# Altium footprint library USER_Lib.PcbLib: 105 footprints (part 3 of 7)
Each footprint in its own frame and in the unit in brackets; x right, y up, seen from the top. Pads: shape width x height; smd on the part's side, far side on the other; paste and mask are expansions set on the pad; w line width, h text height; cw(c..) or ccw(c..) is an arc to the next point about the centre after c.
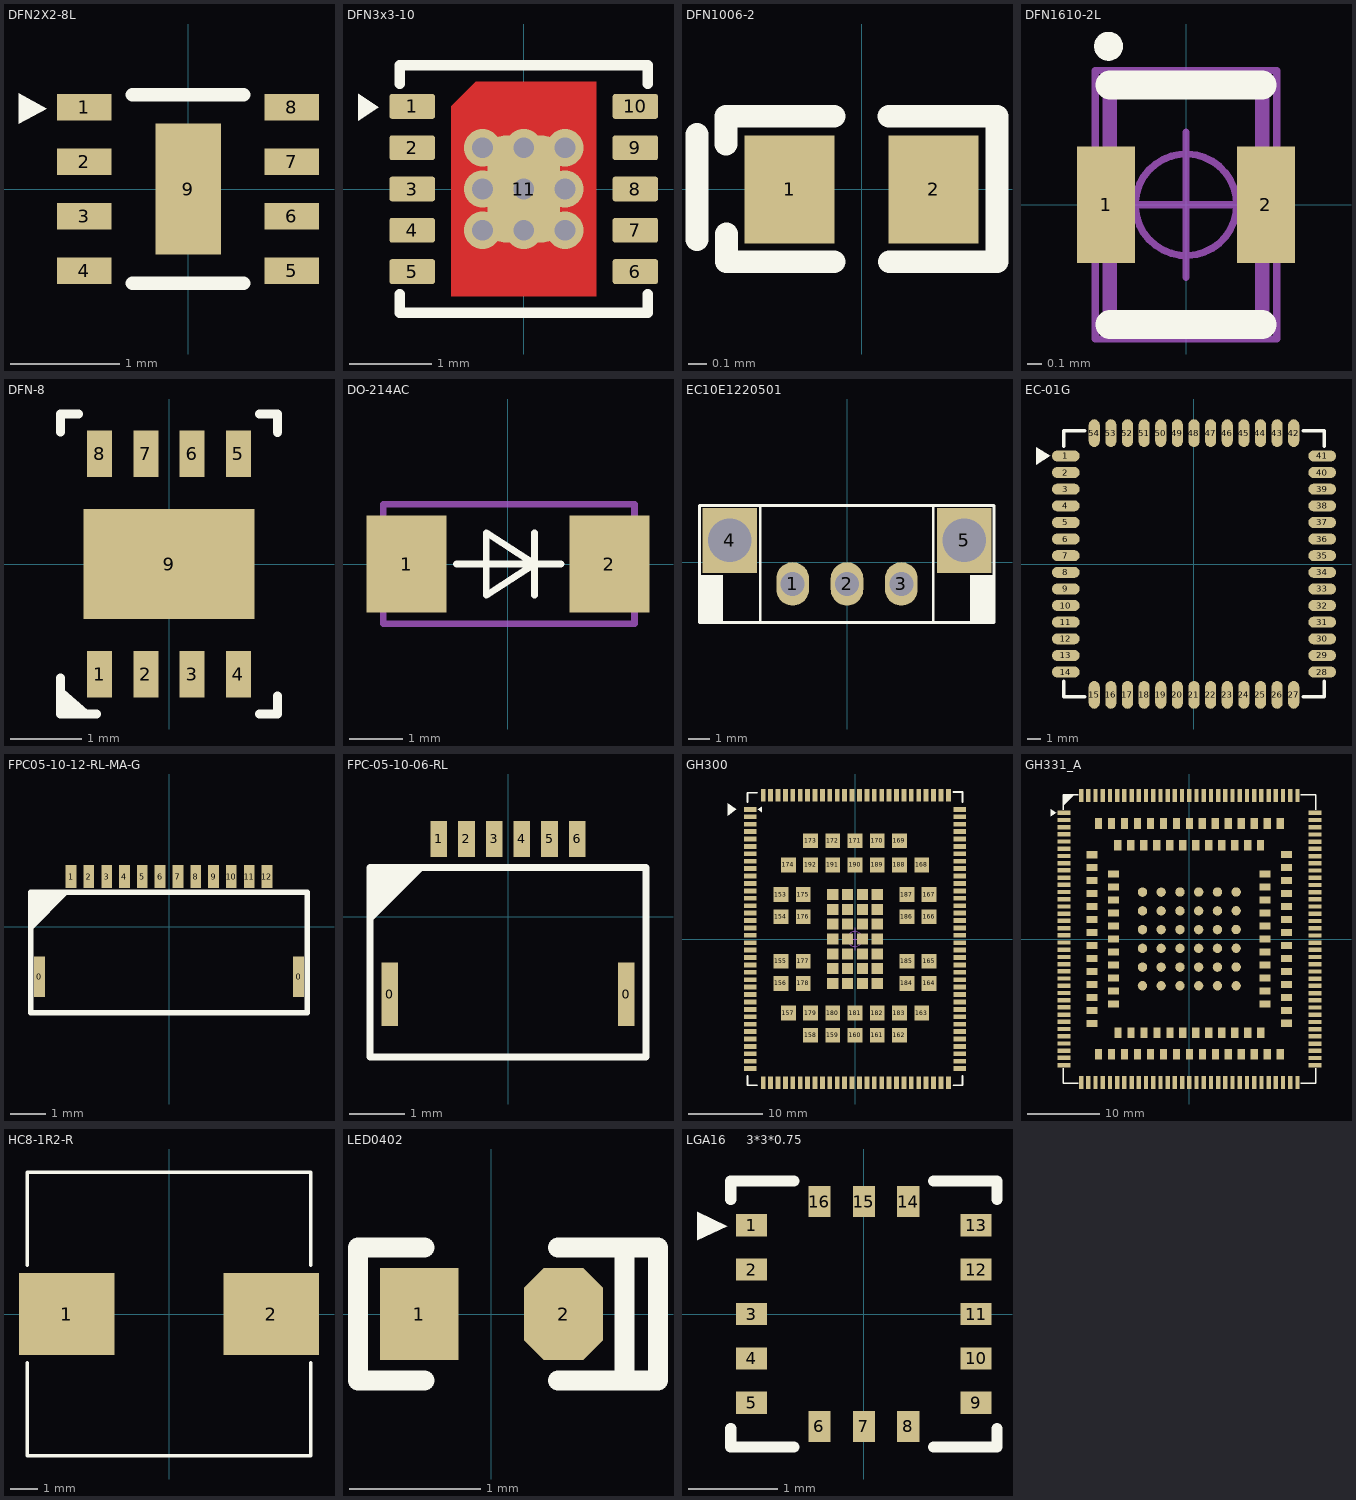
[diagram p2: the footprints below, top view; thin cyan lines are the x and y axes]

## DFN2X2-8L [mm]
pads (9):
  rect 0.5x0.24 smd mask+0.102: 1(-0.95,0.75) 2(-0.95,0.25) 3(-0.95,-0.25) 4(-0.95,-0.75) 5(0.95,-0.75) 6(0.95,-0.25) 7(0.95,0.25) 8(0.95,0.75)
  rect 0.6x1.2 smd mask+0.102: 9(0,0)
Top Overlay:
  region: -1.549,0.597 -1.295,0.737 -1.549,0.876
  lines w0.127: -0.508,-0.864 0.508,-0.864 ; -0.508,0.864 0.508,0.864
3D body "DFN2X2-8L.STEP": height 0.75, standoff 0, extent -1,-1 1,1

## DFN3x3-10 [mm]
pads (11):
  rrect20% 0.55x0.3 smd mask+0.102: 1(-1.35,1) 2(-1.35,0.5) 3(-1.35,0) 4(-1.35,-0.5) 5(-1.35,-1) 6(1.35,-1) 7(1.35,-0.5) 8(1.35,0) 9(1.35,0.5) 10(1.35,1)
  rrect50% 0.875x1.3 smd mask+0.102: 11(0,0)
via -0.5,0.5 diameter 0.45 hole 0.25
via 0,0.5 diameter 0.45 hole 0.25
via 0.5,0.5 diameter 0.45 hole 0.25
via 0.5,0 diameter 0.45 hole 0.25
via 0,0 diameter 0.45 hole 0.25
via -0.5,0 diameter 0.45 hole 0.25
via -0.5,-0.5 diameter 0.45 hole 0.25
via 0,-0.5 diameter 0.45 hole 0.25
via 0.5,-0.5 diameter 0.45 hole 0.25
Top Layer:
  region: -0.875,-1.3 -0.875,1.005 -0.58,1.3 0.875,1.3 0.875,-1.3
Top Overlay:
  region: -2.007,1.156 -1.753,0.991 -2.007,0.826
  lines w0.127: -1.5,-1.274 -1.5,-1.5 1.5,-1.5 1.5,-1.276 ; -1.5,1.276 -1.5,1.5 1.5,1.5 1.5,1.274
Top Solder:
  region: -0.875,-1.3 -0.875,1.005 -0.58,1.3 0.875,1.3 0.875,-1.3
3D body "DFN3x3-10.STEP": height 0.65, standoff 0, extent -1.5,-1.5 1.5,1.5

## DFN1006-2 [mm]
pads (2):
  rect 0.5x0.6 smd mask+0.102: 1(-0.4,0) 2(0.4,0)
Top Overlay:
  lines w0.127: -0.914,-0.279 -0.914,0.076 -0.914,0.305 ; -0.753,0.251 -0.753,0.406 ; -0.752,-0.402 -0.153,-0.402 ; -0.752,0.406 -0.751,0.406 -0.152,0.406 ; -0.751,-0.402 -0.751,-0.247 ; 0.152,0.406 0.751,0.406 ; 0.153,-0.402 0.752,-0.402 0.752,0.406
3D body "DFN1006-2.STEP": height 0.48, standoff -0.02, extent -0.5,-0.3 0.5,0.3

## DFN1610-2L [mm] "DFN, 2-Leads, Body 1.60x1.00mm, Pitch 1.10mm, IPC High Density"
height 0.55
pads (2):
  rect 0.4x0.8 smd: 1(-0.55,0) 2(0.55,0)
Top Overlay:
  circle w0.1: c-0.533,1.092 r0.05
  lines w0.2: -0.525,-0.825 0.525,-0.825 ; -0.525,0.825 0.525,0.825
Mechanical 13:
  lines w0.1: -0.525,-0.825 0.525,-0.825 0.525,0.825 -0.525,0.825 -0.525,-0.825
Mechanical 15:
  circle w0.05: c0,0 r0.35
  lines w0.05: -0.5,0 0.5,0 ; 0,-0.5 0,0.5 ; -0.625,-0.925 0.625,-0.925 0.625,0.925 -0.625,0.925 -0.625,-0.925
3D body "DFN110P100X55-2L.step": height 0.55, standoff 0, extent -0.775,-0.825 0.775,0.825

## DFN-8 [mm] "MCP1726_DFN-8"
pads (9):
  rect 0.35x0.65 smd mask+0.102: 1(-0.975,-1.55) 2(-0.325,-1.55) 3(0.325,-1.55) 4(0.975,-1.55) 5(0.975,1.55) 6(0.325,1.55) 7(-0.325,1.55) 8(-0.975,1.55)
  rect 2.4x1.55 smd mask+0.102: 9(0,0)
Top Overlay:
  lines w0.127: -1.524,-1.6 -1.524,-2.108 -1.016,-2.108 ; -1.524,1.854 -1.524,2.108 -1.27,2.108 ; -1.522,-1.945 -1.352,-2.104 ; -1.514,-1.816 -1.184,-2.103 ; 1.269,2.106 1.523,2.106 1.523,1.852 ; 1.27,-2.108 1.524,-2.108 1.524,-1.854

## DO-214AC [mm]
pads (2):
  rect 1.5x1.82 smd mask+0.102: 1(-1.9,0) 2(1.9,0)
Top Overlay:
  lines w0.127: -0.965,0 0,0 0.991,0 ; 0.495,-0.584 0.495,0 ; 0.495,0.584 0.495,0 ; 0.508,0 0.495,0 ; 0.495,0 -0.406,-0.584 -0.406,0 -0.406,0.584 0.495,0
Mechanical 15:
  lines w0.127: 2.367,-1.082 2.367,1.118 -2.337,1.118 -2.337,-1.118 2.368,-1.118
3D body: height 1.7, standoff 0, extent -2.337,-1.118 2.362,1.118

## EC10E1220501 [mm]
pads (5):
  oval 1.5x2 hole 1.1: 1(-2.5,-1) 2(0,-1) 3(2.5,-1)
  rect 2.5x3 hole 2: 4(-5.4,1) 5(5.4,1)
Top Overlay:
  region: 5.681,-2.769 5.681,-0.599 6.756,-0.599 6.756,-2.769
  region: -6.782,-2.769 -6.782,-0.599 -5.706,-0.599 -5.706,-2.769
  lines w0.127: -3.988,-2.769 -3.988,2.591 ; 3.962,-2.769 3.962,2.591 ; -6.782,-2.769 -6.782,2.602 6.756,2.602 6.756,-2.769 -6.782,-2.769
3D body "鼠标1.sldasm-Part-3.STEP": height 13.23, standoff -2.87, extent -5.704,-2.769 5.755,2.331

## EC-01G [mm] "安信可EC-01G 模组"
pads (54):
  oval 2x0.8 smd mask+0.102: 1(-9.25,7.8) 2(-9.25,6.6) 3(-9.25,5.4) 4(-9.25,4.2) 5(-9.25,3) 6(-9.25,1.8) 7(-9.25,0.6) 8(-9.25,-0.6) 9(-9.25,-1.8) 10(-9.25,-3) 11(-9.25,-4.2) 12(-9.25,-5.4) 13(-9.25,-6.6) 14(-9.25,-7.8) 28(9.25,-7.8) 29(9.25,-6.6) 30(9.25,-5.4) 31(9.25,-4.2) 32(9.25,-3) 33(9.25,-1.8) 34(9.25,-0.6) 35(9.25,0.6) 36(9.25,1.8) 37(9.25,3) 38(9.25,4.2) 39(9.25,5.4) 40(9.25,6.6) 41(9.25,7.8)
  oval 0.8x2 smd mask+0.102: 15(-7.2,-9.45) 16(-6,-9.45) 17(-4.8,-9.45) 18(-3.6,-9.45) 19(-2.4,-9.45) 20(-1.2,-9.45) 21(0,-9.45) 22(1.2,-9.45) 23(2.4,-9.45) 24(3.6,-9.45) 25(4.8,-9.45) 26(6,-9.45) 27(7.2,-9.45) 42(7.2,9.45) 43(6,9.45) 44(4.8,9.45) 45(3.6,9.45) 46(2.4,9.45) 47(1.2,9.45) 48(0,9.45) 49(-1.2,9.45) 50(-2.4,9.45) 51(-3.6,9.45) 52(-4.8,9.45) 53(-6,9.45) 54(-7.2,9.45)
Top Overlay:
  region: -11.405,8.433 -10.389,7.798 -11.405,7.163
  lines w0.254: -9.407,-8.479 -9.407,-9.598 -7.878,-9.598 ; -9.401,8.483 -9.401,9.601 -7.873,9.601 ; 7.873,-9.594 9.402,-9.594 9.402,-8.475 ; 7.877,9.614 9.405,9.614 9.405,8.495
3D body "EC-01G.STEP": height 2.8, standoff 0, extent -9.4,-9.6 9.4,9.6

## FPC05-10-12-RL-MA-G [mm]
pads (14):
  rect 0.3x1.15 smd: 0(-3.635,-1.405) 0(3.635,-1.405)
  rect 0.3x0.65 smd: 1(-2.75,1.405) 2(-2.25,1.405) 3(-1.75,1.405) 4(-1.25,1.405) 5(-0.75,1.405) 6(-0.25,1.405) 7(0.25,1.405) 8(0.75,1.405) 9(1.25,1.405) 10(1.75,1.405) 11(2.25,1.405) 12(2.75,1.405)
Top Overlay:
  region: -3.885,0.97 -2.885,0.97 -3.885,-0.03
  lines w0.152: -3.885,0.97 -3.885,-1.405 -3.885,-2.421 3.885,-2.421 3.885,-1.405 3.885,0.97 -3.885,0.97 ; -3.885,0.97 -3.885,-0.03 -2.885,0.97 -3.885,0.97

## FPC-05-10-06-RL [mm] "超薄FPC座"
pads (8):
  rect 0.3x1.15 smd: 0(-2.135,-1.405) 0(2.135,-1.405)
  rect 0.3x0.65 smd: 1(-1.25,1.405) 2(-0.75,1.405) 3(-0.25,1.405) 4(0.25,1.405) 5(0.75,1.405) 6(1.25,1.405)
Top Overlay:
  region: -2.489,-0.111 -2.489,0.889 -1.489,0.889
  lines w0.127: -2.489,-2.54 0,-2.54 2.489,-2.54 2.489,0.889 0,0.889 -2.489,0.889 -2.489,-2.54

## GH300 [mm]
pads (192):
  rect 1.7x0.65 smd: 1(-14.15,17.5) 2(-14.15,16.5) 3(-14.15,15.5) 4(-14.15,14.5) 5(-14.15,13.5) 6(-14.15,12.5) 7(-14.15,11.5) 8(-14.15,10.5) 9(-14.15,9.5) 10(-14.15,8.5) 11(-14.15,7.5) 12(-14.15,6.5) 13(-14.15,5.5) 14(-14.15,4.5) 15(-14.15,3.5) 16(-14.15,2.5) 17(-14.15,1.5) 18(-14.15,0.5) 19(-14.15,-0.5) 20(-14.15,-1.5) 21(-14.15,-2.5) 22(-14.15,-3.5) 23(-14.15,-4.5) 24(-14.15,-5.5) 25(-14.15,-6.5) 26(-14.15,-7.5) 27(-14.15,-8.5) 28(-14.15,-9.5) 29(-14.15,-10.5) 30(-14.15,-11.5) 31(-14.15,-12.5) 32(-14.15,-13.5) 33(-14.15,-14.5) 34(-14.15,-15.5) 35(-14.15,-16.5) 36(-14.15,-17.5) 63(14.15,-17.5) 64(14.15,-16.5) 65(14.15,-15.5) 66(14.15,-14.5) 67(14.15,-13.5) 68(14.15,-12.5) 69(14.15,-11.5) 70(14.15,-10.5) 71(14.15,-9.5) 72(14.15,-8.5) 73(14.15,-7.5) 74(14.15,-6.5) 75(14.15,-5.5) 76(14.15,-4.5) 77(14.15,-3.5) 78(14.15,-2.5) 79(14.15,-1.5) 80(14.15,-0.5) 81(14.15,0.5) 82(14.15,1.5) 83(14.15,2.5) 84(14.15,3.5) 85(14.15,4.5) 86(14.15,5.5) 87(14.15,6.5) 88(14.15,7.5) 89(14.15,8.5) 90(14.15,9.5) 91(14.15,10.5) 92(14.15,11.5) 93(14.15,12.5) 94(14.15,13.5) 95(14.15,14.5) 96(14.15,15.5) 97(14.15,16.5) 98(14.15,17.5)
  rect 0.65x1.7 smd: 37(-12.4,-19.4) 38(-11.4,-19.4) 39(-10.4,-19.4) 40(-9.4,-19.4) 41(-8.4,-19.4) 42(-7.4,-19.4) 43(-6.4,-19.4) 44(-5.4,-19.4) 45(-4.4,-19.4) 46(-3.4,-19.4) 47(-2.4,-19.4) 48(-1.4,-19.4) 49(-0.4,-19.4) 50(0.6,-19.4) 51(1.6,-19.4) 52(2.6,-19.4) 53(3.6,-19.4) 54(4.6,-19.4) 55(5.6,-19.4) 56(6.6,-19.4) 57(7.6,-19.4) 58(8.6,-19.4) 59(9.6,-19.4) 60(10.6,-19.4) 61(11.6,-19.4) 62(12.6,-19.4) 99(12.6,19.4) 100(11.6,19.4) 101(10.6,19.4) 102(9.6,19.4) 103(8.6,19.4) 104(7.6,19.4) 105(6.6,19.4) 106(5.6,19.4) 107(4.6,19.4) 108(3.6,19.4) 109(2.6,19.4) 110(1.6,19.4) 111(0.6,19.4) 112(-0.4,19.4) 113(-1.4,19.4) 114(-2.4,19.4) 115(-3.4,19.4) 116(-4.4,19.4) 117(-5.4,19.4) 118(-6.4,19.4) 119(-7.4,19.4) 120(-8.4,19.4) 121(-9.4,19.4) 122(-10.4,19.4) 123(-11.4,19.4) 124(-12.4,19.4)
  rect 1.5x1.5 smd: 125(-3,6) 126(-3,4) 127(-3,2) 128(-3,0) 129(-3,-2) 130(-3,-4) 131(-3,-6) 132(-1,-6) 133(1,-6) 134(3,-6) 135(3,-4) 136(3,-2) 137(3,0) 138(3,2) 139(3,4) 140(3,6) 141(1,6) 142(-1,6) 143(-1,4) 144(-1,2) 145(-1,0) 146(-1,-2) 147(-1,-4) 148(1,-4) 149(1,-2) 150(1,0) 151(1,2) 152(1,4)
  rect 2x2 smd: 153(-10,6) 154(-10,3) 155(-10,-3) 156(-10,-6) 157(-9,-10) 158(-6,-13) 159(-3,-13) 160(0,-13) 161(3,-13) 162(6,-13) 163(9,-10) 164(10,-6) 165(10,-3) 166(10,3) 167(10,6) 168(9,10) 169(6,13.257) 170(3,13.257) 171(0,13.257) 172(-3,13.257) 173(-6,13.257) 174(-9,10) 175(-7,6) 176(-7,3) 177(-7,-3) 178(-7,-6) 179(-6,-10) 180(-3,-10) 181(0,-10) 182(3,-10) 183(6,-10) 184(7,-6) 185(7,-3) 186(7,3) 187(7,6) 188(6,10) 189(3,10) 190(0,10) 191(-3,10) 192(-6,10)
Top Overlay:
  region: -17.167,16.643 -16.024,17.5 -17.167,18.357
  region: -12.595,17.881 -13.103,17.5 -12.595,17.119
  lines w0.254: -14.497,-18.5 -14.497,-19.75 -13.247,-19.75 ; -14.497,18.5 -14.497,19.75 -13.247,19.75 ; -14.497,19.725 -14.472,19.7 ; 13.253,-19.75 14.503,-19.75 14.503,-18.5 ; 13.253,19.825 14.503,19.825 ; 14.503,18.5 14.503,19.75
Mechanical 15:
  circle w0.1: c0,0 r1.016
  lines w0.1: -1.524,0 1.524,0 ; 0,-1.524 0,1.524
3D body: height 2.4, standoff -0.01, extent -14.5,-19.787 14.5,19.788

## GH331_A [mm]
pads (274):
  rect 1.8x0.6 smd paste+0 mask+0.102: 1(-17.395,17.513) 2(-17.395,16.513) 3(-17.395,15.513) 4(-17.395,14.513) 5(-17.395,13.513) 6(-17.395,12.513) 7(-17.395,11.513) 8(-17.395,10.513) 9(-17.395,9.513) 10(-17.395,8.513) 11(-17.395,7.513) 12(-17.395,6.513) 13(-17.395,5.513) 14(-17.395,4.513) 15(-17.395,3.513) 16(-17.395,2.513) 17(-17.395,1.513) 18(-17.395,0.513) 19(-17.395,-0.487) 20(-17.395,-1.487) 21(-17.395,-2.487) 22(-17.395,-3.487) 23(-17.395,-4.487) 24(-17.395,-5.487) 25(-17.395,-6.487) 26(-17.395,-7.487) 27(-17.395,-8.487) 28(-17.395,-9.487) 29(-17.395,-10.487) 30(-17.395,-11.487) 31(-17.395,-12.487) 32(-17.395,-13.487) 33(-17.395,-14.487) 34(-17.395,-15.487) 35(-17.395,-16.487) 36(-17.395,-17.487) 68(17.395,-17.503) 69(17.395,-16.503) 70(17.395,-15.503) 71(17.395,-14.503) 72(17.395,-13.503) 73(17.395,-12.503) 74(17.395,-11.503) 75(17.395,-10.503) 76(17.395,-9.503) 77(17.395,-8.503) 78(17.395,-7.503) 79(17.395,-6.503) 80(17.395,-5.503) 81(17.395,-4.503) 82(17.395,-3.503) 83(17.395,-2.503) 84(17.395,-1.503) 85(17.395,-0.503) 86(17.395,0.497) 87(17.395,1.497) 88(17.395,2.497) 89(17.395,3.497) 90(17.395,4.497) 91(17.395,5.497) 92(17.395,6.497) 93(17.395,7.497) 94(17.395,8.497) 95(17.395,9.497) 96(17.395,10.497) 97(17.395,11.497) 98(17.395,12.497) 99(17.395,13.497) 100(17.395,14.497) 101(17.395,15.497) 102(17.395,16.497) 103(17.395,17.497)
  rect 0.6x1.8 smd paste+0 mask+0.102: 37(-15.008,-19.901) 38(-14.008,-19.901) 39(-13.008,-19.901) 40(-12.008,-19.901) 41(-11.008,-19.901) 42(-10.008,-19.901) 43(-9.008,-19.901) 44(-8.008,-19.901) 45(-7.008,-19.901) 46(-6.008,-19.901) 47(-5.008,-19.901) 48(-4.008,-19.901) 49(-3.008,-19.901) 50(-2.008,-19.901) 51(-1.008,-19.901) 52(-0.008,-19.901) 53(0.992,-19.901) 54(1.992,-19.901) 55(2.992,-19.901) 56(3.992,-19.901) 57(4.992,-19.901) 58(5.992,-19.901) 59(6.992,-19.901) 60(7.992,-19.901) 61(8.992,-19.901) 62(9.992,-19.901) 63(10.992,-19.901) 64(11.992,-19.901) 65(12.992,-19.901) 66(13.992,-19.901) 67(14.992,-19.901) 104(14.99,19.901) 105(13.99,19.901) 106(12.99,19.901) 107(11.99,19.901) 108(10.99,19.901) 109(9.99,19.901) 110(8.99,19.901) 111(7.99,19.901) 112(6.99,19.901) 113(5.99,19.901) 114(4.99,19.901) 115(3.99,19.901) 116(2.99,19.901) 117(1.99,19.901) 118(0.99,19.901) 119(-0.01,19.901) 120(-1.01,19.901) 121(-2.01,19.901) 122(-3.01,19.901) 123(-4.01,19.901) 124(-5.01,19.901) 125(-6.01,19.901) 126(-7.01,19.901) 127(-8.01,19.901) 128(-9.01,19.901) 129(-10.01,19.901) 130(-11.01,19.901) 131(-12.01,19.901) 132(-13.01,19.901) 133(-14.01,19.901) 134(-15.01,19.901)
  rect 1.501x1.001 smd paste+0 mask+0.102: 135(-13.509,11.697) 136(-13.509,9.897) 137(-13.509,8.097) 138(-13.509,6.297) 139(-13.509,4.497) 140(-13.509,2.697) 141(-13.509,0.897) 142(-13.509,-0.903) 143(-13.509,-2.703) 144(-13.509,-4.503) 145(-13.509,-6.303) 146(-13.509,-8.103) 147(-13.509,-9.903) 148(-13.509,-11.703) 164(13.491,-11.697) 165(13.491,-9.897) 166(13.491,-8.097) 167(13.491,-6.297) 168(13.491,-4.497) 169(13.491,-2.697) 170(13.491,-0.897) 171(13.491,0.903) 172(13.491,2.703) 173(13.491,4.503) 174(13.491,6.303) 175(13.491,8.103) 176(13.491,9.903) 177(13.491,11.703) 193(-10.512,9.004) 194(-10.512,7.204) 195(-10.512,5.404) 196(-10.512,3.604) 197(-10.512,1.804) 198(-10.512,0.004) 199(-10.512,-1.796) 200(-10.512,-3.596) 201(-10.512,-5.396) 202(-10.512,-7.196) 203(-10.512,-8.996) 216(10.494,-9.004) 217(10.494,-7.204) 218(10.494,-5.404) 219(10.494,-3.604) 220(10.494,-1.804) 221(10.494,-0.004) 222(10.494,1.796) 223(10.494,3.596) 224(10.494,5.396) 225(10.494,7.196) 226(10.494,8.996)
  rect 1.001x1.501 smd paste+0 mask+0.102: 149(-12.595,-15.989) 150(-10.795,-15.989) 151(-8.995,-15.989) 152(-7.195,-15.989) 153(-5.395,-15.989) 154(-3.595,-15.989) 155(-1.795,-15.989) 156(0.005,-15.989) 157(1.805,-15.989) 158(3.605,-15.989) 159(5.405,-15.989) 160(7.205,-15.989) 161(9.005,-15.989) 162(10.805,-15.989) 163(12.605,-15.989) 178(12.602,16.015) 179(10.802,16.015) 180(9.002,16.015) 181(7.202,16.015) 182(5.402,16.015) 183(3.602,16.015) 184(1.802,16.015) 185(0.002,16.015) 186(-1.798,16.015) 187(-3.598,16.015) 188(-5.398,16.015) 189(-7.198,16.015) 190(-8.998,16.015) 191(-10.798,16.015) 192(-12.598,16.015) 204(-9.902,-12.992) 205(-8.102,-12.992) 206(-6.302,-12.992) 207(-4.502,-12.992) 208(-2.702,-12.992) 209(-0.902,-12.992) 210(0.898,-12.992) 211(2.698,-12.992) 212(4.498,-12.992) 213(6.298,-12.992) 214(8.098,-12.992) 215(9.898,-12.992) 227(9.884,12.992) 228(8.084,12.992) 229(6.284,12.992) 230(4.484,12.992) 231(2.684,12.992) 232(0.884,12.992) 233(-0.916,12.992) 234(-2.716,12.992) 235(-4.516,12.992) 236(-6.316,12.992) 237(-8.116,12.992) 238(-9.916,12.992)
  round 1.3 smd: 239(-6.499,6.502) 240(-6.499,3.902) 241(-6.499,1.302) 242(-6.499,-1.298) 243(-6.499,-3.898) 244(-6.512,-6.485) 245(-3.912,-6.485) 246(-1.312,-6.485) 247(1.288,-6.485) 248(3.888,-6.485) 249(6.488,-6.485) 250(6.488,-3.885) 251(6.488,-1.285) 252(6.488,1.315) 253(6.488,3.915) 254(6.488,6.515) 255(3.888,6.515) 256(1.288,6.515) 257(-1.312,6.515) 258(-3.912,6.502) 259(-3.912,3.902) 260(-3.912,1.302) 261(-3.912,-1.298) 262(-3.912,-3.898) 263(-1.312,-3.898) 264(1.288,-3.898) 265(3.888,-3.898) 266(3.888,-1.298) 267(3.888,1.302) 268(3.888,3.902) 269(1.288,3.902) 270(-1.312,3.902) 271(-1.312,1.302) 272(-1.312,-1.298) 273(1.288,-1.298) 274(1.288,1.302)
Top Overlay:
  region: -17.508,20.003 -15.976,20.003 -17.508,18.472
  region: -19.228,17.988 -18.44,17.488 -19.228,16.988
  lines w0.203: -17.508,-17.939 -17.508,-20.003 -15.423,-20.003 ; -17.508,17.939 -17.508,20.003 -15.423,20.003 ; 15.423,-20.003 17.508,-20.003 17.508,-17.939 ; 15.423,20.003 17.508,20.003 17.508,17.939

## HC8-1R2-R [mm] "1.2uH电感"
pads (2):
  rect 3.5x3 smd mask+0.102: 1(-3.75,0) 2(3.75,0)
Top Overlay:
  lines w0.127: -5.2,-1.778 -5.2,-5.2 0,-5.2 5.2,-5.2 5.2,-1.778 ; -5.2,1.778 -5.2,5.2 0,5.2 5.2,5.2 5.2,1.778
3D body "HC8-1R2-R.STEP": height 4, standoff 0, extent -5.45,-5.2 5.45,5.2

## IPEX 1代 [mm]

## LED0402 [mm] "0402贴片灯珠"
pads (2):
  rect 0.6x0.7 smd: 1(-0.55,0)
  oct 0.6x0.7 smd: 2(0.55,0)
Top Overlay:
  lines w0.152: -0.508,-0.508 -1.016,-0.508 -1.016,0.508 -0.508,0.508 ; 0.508,-0.508 1.27,-0.508 1.27,0.508 0.508,0.508 ; 1.016,-0.508 1.016,0.508
3D body "0402SMD_LED.STEP": height 0.45, standoff 0, extent -0.5,-0.25 0.5,0.25

## LGA16     3*3*0.75 [mm]
pads (16):
  rect 0.35x0.25 smd: 1(-1.265,1) 2(-1.265,0.5) 3(-1.265,0) 4(-1.265,-0.5) 5(-1.265,-1) 9(1.265,-1) 10(1.265,-0.5) 11(1.265,0) 12(1.265,0.5) 13(1.265,1)
  rect 0.25x0.35 smd: 6(-0.5,-1.265) 7(0,-1.265) 8(0.5,-1.265) 14(0.5,1.265) 15(0,1.265) 16(-0.5,1.265)
Top Overlay:
  region: -1.88,1.152 -1.537,0.991 -1.88,0.829
  lines w0.127: -1.5,-1.291 -1.5,-1.499 -0.787,-1.499 ; -1.5,1.291 -1.5,1.499 -0.787,1.499 ; 0.787,-1.499 1.5,-1.499 1.5,-1.291 ; 0.787,1.499 1.5,1.499 1.5,1.291
3D body "LGA16_3x3x0.75mm.STEP": height 0.75, standoff 0, extent -1.5,-1.5 1.5,1.5